# Altium footprint library Connector_Samtec_HLE_SMD.PcbLib: 290 footprints (part 8 of 24)
Each footprint in its own frame and in the unit in brackets; x right, y up, seen from the top. Pads: shape width x height; smd on the part's side, far side on the other; paste and mask are expansions set on the pad; w line width, h text height; cw(c..) or ccw(c..) is an arc to the next point about the centre after c.
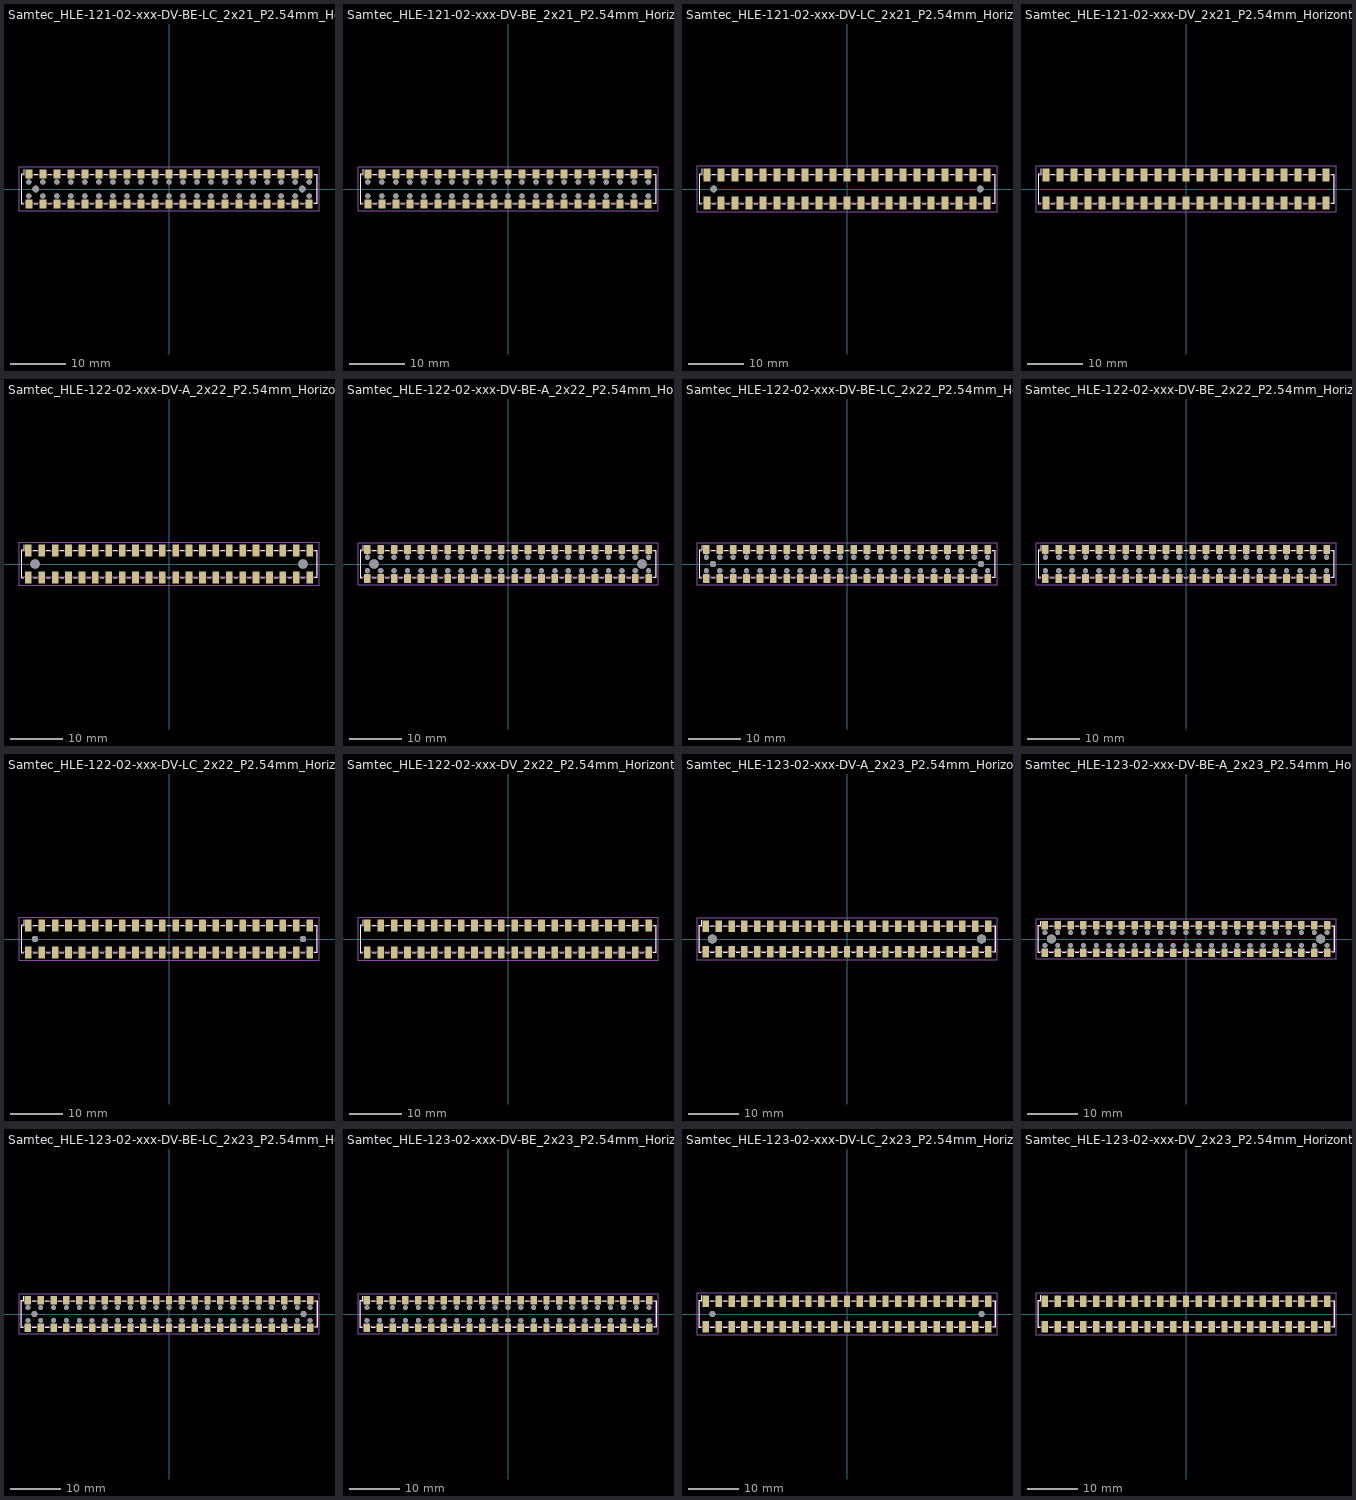
[diagram p7: the footprints below, top view; thin cyan lines are the x and y axes]

## Samtec_HLE-121-02-xxx-DV-BE-LC_2x21_P2.54mm_Horizontal [mm]
pads (86):
  rect 1.27x1.68 smd: 1(-25.4,2.72) 2(-25.4,-2.72) 3(-22.86,2.72) 4(-22.86,-2.72) 5(-20.32,2.72) 6(-20.32,-2.72) 7(-17.78,2.72) 8(-17.78,-2.72) 9(-15.24,2.72) 10(-15.24,-2.72) 11(-12.7,2.72) 12(-12.7,-2.72) 13(-10.16,2.72) 14(-10.16,-2.72) 15(-7.62,2.72) 16(-7.62,-2.72) 17(-5.08,2.72) 18(-5.08,-2.72) 19(-2.54,2.72) 20(-2.54,-2.72) 21(0,2.72) 22(0,-2.72) 23(2.54,2.72) 24(2.54,-2.72) 25(5.08,2.72) 26(5.08,-2.72) 27(7.62,2.72) 28(7.62,-2.72) 29(10.16,2.72) 30(10.16,-2.72) 31(12.7,2.72) 32(12.7,-2.72) 33(15.24,2.72) 34(15.24,-2.72) 35(17.78,2.72) 36(17.78,-2.72) 37(20.32,2.72) 38(20.32,-2.72) 39(22.86,2.72) 40(22.86,-2.72) 41(25.4,2.72) 42(25.4,-2.72)
  round 0.97 hole 0.97: Un1(25.4,-1.27) Un2(-7.62,-1.27) Un3(7.62,1.27) Un4(20.32,1.27) Un5(15.24,-1.27) Un6(5.08,-1.27) Un7(5.08,1.27) Un8(-2.54,1.27) Un9(0,-1.27) Un11(-20.32,1.27) Un12(-22.86,1.27) Un13(2.54,1.27) Un14(-17.78,-1.27) Un15(17.78,-1.27) Un16(22.86,1.27) Un17(-20.32,-1.27) Un18(17.78,1.27) Un19(-12.7,-1.27) Un20(-10.16,1.27) Un21(7.62,-1.27) Un22(-22.86,-1.27) Un23(-12.7,1.27) Un24(-5.08,1.27) Un25(2.54,-1.27) Un27(12.7,-1.27) Un28(-17.78,1.27) Un29(15.24,1.27) Un30(-15.24,-1.27) Un31(22.86,-1.27) Un32(25.4,1.27) Un33(0,1.27) Un34(-10.16,-1.27) Un35(-2.54,-1.27) Un36(20.32,-1.27) Un37(10.16,-1.27) Un38(10.16,1.27) Un39(-15.24,1.27) Un40(-25.4,1.27) Un41(-25.4,-1.27) Un42(-7.62,1.27) Un43(12.7,1.27) Un44(-5.08,-1.27)
  round 1.19 hole 1.19: Un10(-24.13,0) Un26(24.13,0)
F.SilkS:
  lines w0.12: -26.295,-2.65 -26.78,-2.65 -26.78,2.65 -26.295,2.65 -26.295,3.56 ; -24.505,-2.65 -23.755,-2.65 ; -24.505,2.65 -23.755,2.65 ; -21.965,-2.65 -21.215,-2.65 ; -21.965,2.65 -21.215,2.65 ; -19.425,-2.65 -18.675,-2.65 ; -19.425,2.65 -18.675,2.65 ; -16.885,-2.65 -16.135,-2.65 ; -16.885,2.65 -16.135,2.65 ; -14.345,-2.65 -13.595,-2.65 ; -14.345,2.65 -13.595,2.65 ; -11.805,-2.65 -11.055,-2.65 ; -11.805,2.65 -11.055,2.65 ; -9.265,-2.65 -8.515,-2.65 ; -9.265,2.65 -8.515,2.65 ; -6.725,-2.65 -5.975,-2.65 ; -6.725,2.65 -5.975,2.65 ; -4.185,-2.65 -3.435,-2.65 ; -4.185,2.65 -3.435,2.65 ; -1.645,-2.65 -0.895,-2.65 ; -1.645,2.65 -0.895,2.65 ; 0.895,-2.65 1.645,-2.65 ; 0.895,2.65 1.645,2.65 ; 3.435,-2.65 4.185,-2.65 ; 3.435,2.65 4.185,2.65 ; 5.975,-2.65 6.725,-2.65 ; 5.975,2.65 6.725,2.65 ; 8.515,-2.65 9.265,-2.65 ; 8.515,2.65 9.265,2.65 ; 11.055,-2.65 11.805,-2.65 ; 11.055,2.65 11.805,2.65 ; 13.595,-2.65 14.345,-2.65 ; 13.595,2.65 14.345,2.65 ; 16.135,-2.65 16.885,-2.65 ; 16.135,2.65 16.885,2.65 ; 18.675,-2.65 19.425,-2.65 ; 18.675,2.65 19.425,2.65 ; 21.215,-2.65 21.965,-2.65 ; 21.215,2.65 21.965,2.65 ; 23.755,-2.65 24.505,-2.65 ; 23.755,2.65 24.505,2.65 ; 26.295,-2.65 26.78,-2.65 26.78,2.65 26.295,2.65
F.CrtYd:
  lines w0.05: -27.17,-4.06 -27.17,4.06 27.17,4.06 27.17,-4.06 -27.17,-4.06
F.Fab:
  lines w0.1: -25.9,2.54 -25.4,1.833 -24.9,2.54 ; -26.67,-2.54 26.67,-2.54 26.67,2.54 -26.67,2.54 -26.67,-2.54
  text "'.Designator'" at -4.047,-2.68 h1

## Samtec_HLE-121-02-xxx-DV-BE_2x21_P2.54mm_Horizontal [mm]
pads (84):
  rect 1.27x1.68 smd: 1(-25.4,2.72) 2(-25.4,-2.72) 3(-22.86,2.72) 4(-22.86,-2.72) 5(-20.32,2.72) 6(-20.32,-2.72) 7(-17.78,2.72) 8(-17.78,-2.72) 9(-15.24,2.72) 10(-15.24,-2.72) 11(-12.7,2.72) 12(-12.7,-2.72) 13(-10.16,2.72) 14(-10.16,-2.72) 15(-7.62,2.72) 16(-7.62,-2.72) 17(-5.08,2.72) 18(-5.08,-2.72) 19(-2.54,2.72) 20(-2.54,-2.72) 21(0,2.72) 22(0,-2.72) 23(2.54,2.72) 24(2.54,-2.72) 25(5.08,2.72) 26(5.08,-2.72) 27(7.62,2.72) 28(7.62,-2.72) 29(10.16,2.72) 30(10.16,-2.72) 31(12.7,2.72) 32(12.7,-2.72) 33(15.24,2.72) 34(15.24,-2.72) 35(17.78,2.72) 36(17.78,-2.72) 37(20.32,2.72) 38(20.32,-2.72) 39(22.86,2.72) 40(22.86,-2.72) 41(25.4,2.72) 42(25.4,-2.72)
  round 0.97 hole 0.97: Un1(20.32,-1.27) Un2(20.32,1.27) Un3(10.16,-1.27) Un4(0,1.27) Un5(-5.08,-1.27) Un6(-17.78,-1.27) Un7(7.62,1.27) Un8(-15.24,-1.27) Un9(25.4,1.27) Un10(22.86,-1.27) Un11(-7.62,1.27) Un12(2.54,-1.27) Un13(-2.54,-1.27) Un14(15.24,1.27) Un15(-25.4,1.27) Un16(15.24,-1.27) Un17(-10.16,1.27) Un18(-5.08,1.27) Un19(0,-1.27) Un20(25.4,-1.27) Un21(-17.78,1.27) Un22(-12.7,1.27) Un23(-15.24,1.27) Un24(10.16,1.27) Un25(5.08,1.27) Un26(22.86,1.27) Un27(-7.62,-1.27) Un28(5.08,-1.27) Un29(7.62,-1.27) Un30(2.54,1.27) Un31(-20.32,1.27) Un32(12.7,-1.27) Un33(-25.4,-1.27) Un34(-10.16,-1.27) Un35(12.7,1.27) Un36(-22.86,1.27) Un37(-12.7,-1.27) Un38(-20.32,-1.27) Un39(17.78,-1.27) Un40(-22.86,-1.27) Un41(17.78,1.27) Un42(-2.54,1.27)
F.SilkS:
  lines w0.12: -26.295,-2.65 -26.78,-2.65 -26.78,2.65 -26.295,2.65 -26.295,3.56 ; -24.505,-2.65 -23.755,-2.65 ; -24.505,2.65 -23.755,2.65 ; -21.965,-2.65 -21.215,-2.65 ; -21.965,2.65 -21.215,2.65 ; -19.425,-2.65 -18.675,-2.65 ; -19.425,2.65 -18.675,2.65 ; -16.885,-2.65 -16.135,-2.65 ; -16.885,2.65 -16.135,2.65 ; -14.345,-2.65 -13.595,-2.65 ; -14.345,2.65 -13.595,2.65 ; -11.805,-2.65 -11.055,-2.65 ; -11.805,2.65 -11.055,2.65 ; -9.265,-2.65 -8.515,-2.65 ; -9.265,2.65 -8.515,2.65 ; -6.725,-2.65 -5.975,-2.65 ; -6.725,2.65 -5.975,2.65 ; -4.185,-2.65 -3.435,-2.65 ; -4.185,2.65 -3.435,2.65 ; -1.645,-2.65 -0.895,-2.65 ; -1.645,2.65 -0.895,2.65 ; 0.895,-2.65 1.645,-2.65 ; 0.895,2.65 1.645,2.65 ; 3.435,-2.65 4.185,-2.65 ; 3.435,2.65 4.185,2.65 ; 5.975,-2.65 6.725,-2.65 ; 5.975,2.65 6.725,2.65 ; 8.515,-2.65 9.265,-2.65 ; 8.515,2.65 9.265,2.65 ; 11.055,-2.65 11.805,-2.65 ; 11.055,2.65 11.805,2.65 ; 13.595,-2.65 14.345,-2.65 ; 13.595,2.65 14.345,2.65 ; 16.135,-2.65 16.885,-2.65 ; 16.135,2.65 16.885,2.65 ; 18.675,-2.65 19.425,-2.65 ; 18.675,2.65 19.425,2.65 ; 21.215,-2.65 21.965,-2.65 ; 21.215,2.65 21.965,2.65 ; 23.755,-2.65 24.505,-2.65 ; 23.755,2.65 24.505,2.65 ; 26.295,-2.65 26.78,-2.65 26.78,2.65 26.295,2.65
F.CrtYd:
  lines w0.05: -27.17,-4.06 -27.17,4.06 27.17,4.06 27.17,-4.06 -27.17,-4.06
F.Fab:
  lines w0.1: -25.9,2.54 -25.4,1.833 -24.9,2.54 ; -26.67,-2.54 -26.67,2.54 26.67,2.54 26.67,-2.54 -26.67,-2.54
  text "'.Designator'" at -4.047,-2.68 h1

## Samtec_HLE-121-02-xxx-DV-LC_2x21_P2.54mm_Horizontal [mm]
pads (44):
  rect 1.27x2.29 smd: 1(-25.4,2.525) 2(-25.4,-2.525) 3(-22.86,2.525) 4(-22.86,-2.525) 5(-20.32,2.525) 6(-20.32,-2.525) 7(-17.78,2.525) 8(-17.78,-2.525) 9(-15.24,2.525) 10(-15.24,-2.525) 11(-12.7,2.525) 12(-12.7,-2.525) 13(-10.16,2.525) 14(-10.16,-2.525) 15(-7.62,2.525) 16(-7.62,-2.525) 17(-5.08,2.525) 18(-5.08,-2.525) 19(-2.54,2.525) 20(-2.54,-2.525) 21(0,2.525) 22(0,-2.525) 23(2.54,2.525) 24(2.54,-2.525) 25(5.08,2.525) 26(5.08,-2.525) 27(7.62,2.525) 28(7.62,-2.525) 29(10.16,2.525) 30(10.16,-2.525) 31(12.7,2.525) 32(12.7,-2.525) 33(15.24,2.525) 34(15.24,-2.525) 35(17.78,2.525) 36(17.78,-2.525) 37(20.32,2.525) 38(20.32,-2.525) 39(22.86,2.525) 40(22.86,-2.525) 41(25.4,2.525) 42(25.4,-2.525)
  round 1.19 hole 1.19: Un1(-24.13,0) Un2(24.13,0)
F.SilkS:
  lines w0.12: -26.295,-2.65 -26.78,-2.65 -26.78,2.65 -26.295,2.65 -26.295,3.67 ; -24.505,-2.65 -23.755,-2.65 ; -24.505,2.65 -23.755,2.65 ; -21.965,-2.65 -21.215,-2.65 ; -21.965,2.65 -21.215,2.65 ; -19.425,-2.65 -18.675,-2.65 ; -19.425,2.65 -18.675,2.65 ; -16.885,-2.65 -16.135,-2.65 ; -16.885,2.65 -16.135,2.65 ; -14.345,-2.65 -13.595,-2.65 ; -14.345,2.65 -13.595,2.65 ; -11.805,-2.65 -11.055,-2.65 ; -11.805,2.65 -11.055,2.65 ; -9.265,-2.65 -8.515,-2.65 ; -9.265,2.65 -8.515,2.65 ; -6.725,-2.65 -5.975,-2.65 ; -6.725,2.65 -5.975,2.65 ; -4.185,-2.65 -3.435,-2.65 ; -4.185,2.65 -3.435,2.65 ; -1.645,-2.65 -0.895,-2.65 ; -1.645,2.65 -0.895,2.65 ; 0.895,-2.65 1.645,-2.65 ; 0.895,2.65 1.645,2.65 ; 3.435,-2.65 4.185,-2.65 ; 3.435,2.65 4.185,2.65 ; 5.975,-2.65 6.725,-2.65 ; 5.975,2.65 6.725,2.65 ; 8.515,-2.65 9.265,-2.65 ; 8.515,2.65 9.265,2.65 ; 11.055,-2.65 11.805,-2.65 ; 11.055,2.65 11.805,2.65 ; 13.595,-2.65 14.345,-2.65 ; 13.595,2.65 14.345,2.65 ; 16.135,-2.65 16.885,-2.65 ; 16.135,2.65 16.885,2.65 ; 18.675,-2.65 19.425,-2.65 ; 18.675,2.65 19.425,2.65 ; 21.215,-2.65 21.965,-2.65 ; 21.215,2.65 21.965,2.65 ; 23.755,-2.65 24.505,-2.65 ; 23.755,2.65 24.505,2.65 ; 26.295,-2.65 26.78,-2.65 26.78,2.65 26.295,2.65
F.CrtYd:
  lines w0.05: -27.17,-4.17 -27.17,4.17 27.17,4.17 27.17,-4.17 -27.17,-4.17
F.Fab:
  lines w0.1: -25.9,2.54 -25.4,1.833 -24.9,2.54 ; -26.67,-2.54 -26.67,2.54 26.67,2.54 26.67,-2.54 -26.67,-2.54
  text "'.Designator'" at -4.047,-2.68 h1

## Samtec_HLE-121-02-xxx-DV_2x21_P2.54mm_Horizontal [mm]
pads (42):
  rect 1.27x2.29 smd: 1(-25.4,2.525) 2(-25.4,-2.525) 3(-22.86,2.525) 4(-22.86,-2.525) 5(-20.32,2.525) 6(-20.32,-2.525) 7(-17.78,2.525) 8(-17.78,-2.525) 9(-15.24,2.525) 10(-15.24,-2.525) 11(-12.7,2.525) 12(-12.7,-2.525) 13(-10.16,2.525) 14(-10.16,-2.525) 15(-7.62,2.525) 16(-7.62,-2.525) 17(-5.08,2.525) 18(-5.08,-2.525) 19(-2.54,2.525) 20(-2.54,-2.525) 21(0,2.525) 22(0,-2.525) 23(2.54,2.525) 24(2.54,-2.525) 25(5.08,2.525) 26(5.08,-2.525) 27(7.62,2.525) 28(7.62,-2.525) 29(10.16,2.525) 30(10.16,-2.525) 31(12.7,2.525) 32(12.7,-2.525) 33(15.24,2.525) 34(15.24,-2.525) 35(17.78,2.525) 36(17.78,-2.525) 37(20.32,2.525) 38(20.32,-2.525) 39(22.86,2.525) 40(22.86,-2.525) 41(25.4,2.525) 42(25.4,-2.525)
F.SilkS:
  lines w0.12: -26.295,-2.65 -26.78,-2.65 -26.78,2.65 -26.295,2.65 -26.295,3.67 ; -24.505,-2.65 -23.755,-2.65 ; -24.505,2.65 -23.755,2.65 ; -21.965,-2.65 -21.215,-2.65 ; -21.965,2.65 -21.215,2.65 ; -19.425,-2.65 -18.675,-2.65 ; -19.425,2.65 -18.675,2.65 ; -16.885,-2.65 -16.135,-2.65 ; -16.885,2.65 -16.135,2.65 ; -14.345,-2.65 -13.595,-2.65 ; -14.345,2.65 -13.595,2.65 ; -11.805,-2.65 -11.055,-2.65 ; -11.805,2.65 -11.055,2.65 ; -9.265,-2.65 -8.515,-2.65 ; -9.265,2.65 -8.515,2.65 ; -6.725,-2.65 -5.975,-2.65 ; -6.725,2.65 -5.975,2.65 ; -4.185,-2.65 -3.435,-2.65 ; -4.185,2.65 -3.435,2.65 ; -1.645,-2.65 -0.895,-2.65 ; -1.645,2.65 -0.895,2.65 ; 0.895,-2.65 1.645,-2.65 ; 0.895,2.65 1.645,2.65 ; 3.435,-2.65 4.185,-2.65 ; 3.435,2.65 4.185,2.65 ; 5.975,-2.65 6.725,-2.65 ; 5.975,2.65 6.725,2.65 ; 8.515,-2.65 9.265,-2.65 ; 8.515,2.65 9.265,2.65 ; 11.055,-2.65 11.805,-2.65 ; 11.055,2.65 11.805,2.65 ; 13.595,-2.65 14.345,-2.65 ; 13.595,2.65 14.345,2.65 ; 16.135,-2.65 16.885,-2.65 ; 16.135,2.65 16.885,2.65 ; 18.675,-2.65 19.425,-2.65 ; 18.675,2.65 19.425,2.65 ; 21.215,-2.65 21.965,-2.65 ; 21.215,2.65 21.965,2.65 ; 23.755,-2.65 24.505,-2.65 ; 23.755,2.65 24.505,2.65 ; 26.295,-2.65 26.78,-2.65 26.78,2.65 26.295,2.65
F.CrtYd:
  lines w0.05: -27.17,-4.17 -27.17,4.17 27.17,4.17 27.17,-4.17 -27.17,-4.17
F.Fab:
  lines w0.1: -25.9,2.54 -25.4,1.833 -24.9,2.54 ; -26.67,-2.54 -26.67,2.54 26.67,2.54 26.67,-2.54 -26.67,-2.54
  text "'.Designator'" at -4.047,-2.68 h1

## Samtec_HLE-122-02-xxx-DV-A_2x22_P2.54mm_Horizontal [mm]
pads (46):
  rect 1.27x2.29 smd: 1(-26.67,2.525) 2(-26.67,-2.525) 3(-24.13,2.525) 4(-24.13,-2.525) 5(-21.59,2.525) 6(-21.59,-2.525) 7(-19.05,2.525) 8(-19.05,-2.525) 9(-16.51,2.525) 10(-16.51,-2.525) 11(-13.97,2.525) 12(-13.97,-2.525) 13(-11.43,2.525) 14(-11.43,-2.525) 15(-8.89,2.525) 16(-8.89,-2.525) 17(-6.35,2.525) 18(-6.35,-2.525) 19(-3.81,2.525) 20(-3.81,-2.525) 21(-1.27,2.525) 22(-1.27,-2.525) 23(1.27,2.525) 24(1.27,-2.525) 25(3.81,2.525) 26(3.81,-2.525) 27(6.35,2.525) 28(6.35,-2.525) 29(8.89,2.525) 30(8.89,-2.525) 31(11.43,2.525) 32(11.43,-2.525) 33(13.97,2.525) 34(13.97,-2.525) 35(16.51,2.525) 36(16.51,-2.525) 37(19.05,2.525) 38(19.05,-2.525) 39(21.59,2.525) 40(21.59,-2.525) 41(24.13,2.525) 42(24.13,-2.525) 43(26.67,2.525) 44(26.67,-2.525)
  round 1.78 hole 1.78: Un1(-25.4,0) Un2(25.4,0)
F.SilkS:
  lines w0.12: -27.565,-2.65 -28.05,-2.65 -28.05,2.65 -27.565,2.65 -27.565,3.67 ; -25.775,-2.65 -25.025,-2.65 ; -25.775,2.65 -25.025,2.65 ; -23.235,-2.65 -22.485,-2.65 ; -23.235,2.65 -22.485,2.65 ; -20.695,-2.65 -19.945,-2.65 ; -20.695,2.65 -19.945,2.65 ; -18.155,-2.65 -17.405,-2.65 ; -18.155,2.65 -17.405,2.65 ; -15.615,-2.65 -14.865,-2.65 ; -15.615,2.65 -14.865,2.65 ; -13.075,-2.65 -12.325,-2.65 ; -13.075,2.65 -12.325,2.65 ; -10.535,-2.65 -9.785,-2.65 ; -10.535,2.65 -9.785,2.65 ; -7.995,-2.65 -7.245,-2.65 ; -7.995,2.65 -7.245,2.65 ; -5.455,-2.65 -4.705,-2.65 ; -5.455,2.65 -4.705,2.65 ; -2.915,-2.65 -2.165,-2.65 ; -2.915,2.65 -2.165,2.65 ; -0.375,-2.65 0.375,-2.65 ; -0.375,2.65 0.375,2.65 ; 2.165,-2.65 2.915,-2.65 ; 2.165,2.65 2.915,2.65 ; 4.705,-2.65 5.455,-2.65 ; 4.705,2.65 5.455,2.65 ; 7.245,-2.65 7.995,-2.65 ; 7.245,2.65 7.995,2.65 ; 9.785,-2.65 10.535,-2.65 ; 9.785,2.65 10.535,2.65 ; 12.325,-2.65 13.075,-2.65 ; 12.325,2.65 13.075,2.65 ; 14.865,-2.65 15.615,-2.65 ; 14.865,2.65 15.615,2.65 ; 17.405,-2.65 18.155,-2.65 ; 17.405,2.65 18.155,2.65 ; 19.945,-2.65 20.695,-2.65 ; 19.945,2.65 20.695,2.65 ; 22.485,-2.65 23.235,-2.65 ; 22.485,2.65 23.235,2.65 ; 25.025,-2.65 25.775,-2.65 ; 25.025,2.65 25.775,2.65 ; 27.565,-2.65 28.05,-2.65 28.05,2.65 27.565,2.65
F.CrtYd:
  lines w0.05: -28.44,-4.17 -28.44,4.17 28.44,4.17 28.44,-4.17 -28.44,-4.17
F.Fab:
  lines w0.1: -27.17,2.54 -26.67,1.833 -26.17,2.54 ; -27.94,-2.54 -27.94,2.54 27.94,2.54 27.94,-2.54 -27.94,-2.54
  text "'.Designator'" at -4.047,-2.68 h1

## Samtec_HLE-122-02-xxx-DV-BE-A_2x22_P2.54mm_Horizontal [mm]
pads (90):
  rect 1.27x1.68 smd: 1(-26.67,2.72) 2(-26.67,-2.72) 3(-24.13,2.72) 4(-24.13,-2.72) 5(-21.59,2.72) 6(-21.59,-2.72) 7(-19.05,2.72) 8(-19.05,-2.72) 9(-16.51,2.72) 10(-16.51,-2.72) 11(-13.97,2.72) 12(-13.97,-2.72) 13(-11.43,2.72) 14(-11.43,-2.72) 15(-8.89,2.72) 16(-8.89,-2.72) 17(-6.35,2.72) 18(-6.35,-2.72) 19(-3.81,2.72) 20(-3.81,-2.72) 21(-1.27,2.72) 22(-1.27,-2.72) 23(1.27,2.72) 24(1.27,-2.72) 25(3.81,2.72) 26(3.81,-2.72) 27(6.35,2.72) 28(6.35,-2.72) 29(8.89,2.72) 30(8.89,-2.72) 31(11.43,2.72) 32(11.43,-2.72) 33(13.97,2.72) 34(13.97,-2.72) 35(16.51,2.72) 36(16.51,-2.72) 37(19.05,2.72) 38(19.05,-2.72) 39(21.59,2.72) 40(21.59,-2.72) 41(24.13,2.72) 42(24.13,-2.72) 43(26.67,2.72) 44(26.67,-2.72)
  round 0.97 hole 0.97: Un1(-24.13,-1.27) Un2(-19.05,1.27) Un3(6.35,-1.27) Un4(19.05,-1.27) Un5(19.05,1.27) Un6(-13.97,1.27) Un7(3.81,-1.27) Un8(1.27,-1.27) Un9(16.51,1.27) Un10(-16.51,1.27) Un11(-19.05,-1.27) Un12(3.81,1.27) Un13(-24.13,1.27) Un14(-21.59,1.27) Un15(-26.67,-1.27) Un17(-11.43,-1.27) Un18(26.67,1.27) Un19(21.59,-1.27) Un20(13.97,-1.27) Un21(24.13,-1.27) Un22(-6.35,-1.27) Un23(-8.89,-1.27) Un24(26.67,-1.27) Un25(-6.35,1.27) Un26(-1.27,-1.27) Un27(-11.43,1.27) Un28(-8.89,1.27) Un29(21.59,1.27) Un30(-3.81,1.27) Un31(8.89,1.27) Un32(16.51,-1.27) Un33(-26.67,1.27) Un34(-1.27,1.27) Un35(-16.51,-1.27) Un36(11.43,1.27) Un38(1.27,1.27) Un39(11.43,-1.27) Un40(24.13,1.27) Un41(8.89,-1.27) Un42(6.35,1.27) Un43(-3.81,-1.27) Un44(-13.97,-1.27) Un45(-21.59,-1.27) Un46(13.97,1.27)
  round 1.78 hole 1.78: Un16(25.4,0) Un37(-25.4,0)
F.SilkS:
  lines w0.12: -27.565,-2.65 -28.05,-2.65 -28.05,2.65 -27.565,2.65 -27.565,3.56 ; -25.775,-2.65 -25.025,-2.65 ; -25.775,2.65 -25.025,2.65 ; -23.235,-2.65 -22.485,-2.65 ; -23.235,2.65 -22.485,2.65 ; -20.695,-2.65 -19.945,-2.65 ; -20.695,2.65 -19.945,2.65 ; -18.155,-2.65 -17.405,-2.65 ; -18.155,2.65 -17.405,2.65 ; -15.615,-2.65 -14.865,-2.65 ; -15.615,2.65 -14.865,2.65 ; -13.075,-2.65 -12.325,-2.65 ; -13.075,2.65 -12.325,2.65 ; -10.535,-2.65 -9.785,-2.65 ; -10.535,2.65 -9.785,2.65 ; -7.995,-2.65 -7.245,-2.65 ; -7.995,2.65 -7.245,2.65 ; -5.455,-2.65 -4.705,-2.65 ; -5.455,2.65 -4.705,2.65 ; -2.915,-2.65 -2.165,-2.65 ; -2.915,2.65 -2.165,2.65 ; -0.375,-2.65 0.375,-2.65 ; -0.375,2.65 0.375,2.65 ; 2.165,-2.65 2.915,-2.65 ; 2.165,2.65 2.915,2.65 ; 4.705,-2.65 5.455,-2.65 ; 4.705,2.65 5.455,2.65 ; 7.245,-2.65 7.995,-2.65 ; 7.245,2.65 7.995,2.65 ; 9.785,-2.65 10.535,-2.65 ; 9.785,2.65 10.535,2.65 ; 12.325,-2.65 13.075,-2.65 ; 12.325,2.65 13.075,2.65 ; 14.865,-2.65 15.615,-2.65 ; 14.865,2.65 15.615,2.65 ; 17.405,-2.65 18.155,-2.65 ; 17.405,2.65 18.155,2.65 ; 19.945,-2.65 20.695,-2.65 ; 19.945,2.65 20.695,2.65 ; 22.485,-2.65 23.235,-2.65 ; 22.485,2.65 23.235,2.65 ; 25.025,-2.65 25.775,-2.65 ; 25.025,2.65 25.775,2.65 ; 27.565,-2.65 28.05,-2.65 28.05,2.65 27.565,2.65
F.CrtYd:
  lines w0.05: -28.44,-4.06 -28.44,4.06 28.44,4.06 28.44,-4.06 -28.44,-4.06
F.Fab:
  lines w0.1: -27.17,2.54 -26.67,1.833 -26.17,2.54 ; -27.94,-2.54 -27.94,2.54 27.94,2.54 27.94,-2.54 -27.94,-2.54
  text "'.Designator'" at -4.047,-2.68 h1

## Samtec_HLE-122-02-xxx-DV-BE-LC_2x22_P2.54mm_Horizontal [mm]
pads (90):
  rect 1.27x1.68 smd: 1(-26.67,2.72) 2(-26.67,-2.72) 3(-24.13,2.72) 4(-24.13,-2.72) 5(-21.59,2.72) 6(-21.59,-2.72) 7(-19.05,2.72) 8(-19.05,-2.72) 9(-16.51,2.72) 10(-16.51,-2.72) 11(-13.97,2.72) 12(-13.97,-2.72) 13(-11.43,2.72) 14(-11.43,-2.72) 15(-8.89,2.72) 16(-8.89,-2.72) 17(-6.35,2.72) 18(-6.35,-2.72) 19(-3.81,2.72) 20(-3.81,-2.72) 21(-1.27,2.72) 22(-1.27,-2.72) 23(1.27,2.72) 24(1.27,-2.72) 25(3.81,2.72) 26(3.81,-2.72) 27(6.35,2.72) 28(6.35,-2.72) 29(8.89,2.72) 30(8.89,-2.72) 31(11.43,2.72) 32(11.43,-2.72) 33(13.97,2.72) 34(13.97,-2.72) 35(16.51,2.72) 36(16.51,-2.72) 37(19.05,2.72) 38(19.05,-2.72) 39(21.59,2.72) 40(21.59,-2.72) 41(24.13,2.72) 42(24.13,-2.72) 43(26.67,2.72) 44(26.67,-2.72)
  round 0.97 hole 0.97: Un1(-11.43,-1.27) Un2(-16.51,-1.27) Un3(19.05,1.27) Un4(-19.05,-1.27) Un5(-13.97,1.27) Un6(6.35,-1.27) Un7(13.97,1.27) Un8(19.05,-1.27) Un9(24.13,-1.27) Un10(16.51,-1.27) Un11(-26.67,-1.27) Un12(21.59,-1.27) Un13(-13.97,-1.27) Un15(16.51,1.27) Un16(-19.05,1.27) Un17(-16.51,1.27) Un18(11.43,-1.27) Un19(8.89,1.27) Un20(-21.59,1.27) Un21(3.81,-1.27) Un22(8.89,-1.27) Un23(-24.13,1.27) Un24(-3.81,-1.27) Un25(-6.35,-1.27) Un26(-1.27,1.27) Un27(1.27,-1.27) Un28(3.81,1.27) Un29(-3.81,1.27) Un30(26.67,-1.27) Un31(6.35,1.27) Un32(-11.43,1.27) Un33(24.13,1.27) Un34(-8.89,1.27) Un35(13.97,-1.27) Un36(-24.13,-1.27) Un37(1.27,1.27) Un38(-26.67,1.27) Un39(21.59,1.27) Un40(11.43,1.27) Un41(-21.59,-1.27) Un43(-1.27,-1.27) Un44(-6.35,1.27) Un45(-8.89,-1.27) Un46(26.67,1.27)
  round 1.19 hole 1.19: Un14(25.4,0) Un42(-25.4,0)
F.SilkS:
  lines w0.12: -27.565,-2.65 -28.05,-2.65 -28.05,2.65 -27.565,2.65 -27.565,3.56 ; -25.775,-2.65 -25.025,-2.65 ; -25.775,2.65 -25.025,2.65 ; -23.235,-2.65 -22.485,-2.65 ; -23.235,2.65 -22.485,2.65 ; -20.695,-2.65 -19.945,-2.65 ; -20.695,2.65 -19.945,2.65 ; -18.155,-2.65 -17.405,-2.65 ; -18.155,2.65 -17.405,2.65 ; -15.615,-2.65 -14.865,-2.65 ; -15.615,2.65 -14.865,2.65 ; -13.075,-2.65 -12.325,-2.65 ; -13.075,2.65 -12.325,2.65 ; -10.535,-2.65 -9.785,-2.65 ; -10.535,2.65 -9.785,2.65 ; -7.995,-2.65 -7.245,-2.65 ; -7.995,2.65 -7.245,2.65 ; -5.455,-2.65 -4.705,-2.65 ; -5.455,2.65 -4.705,2.65 ; -2.915,-2.65 -2.165,-2.65 ; -2.915,2.65 -2.165,2.65 ; -0.375,-2.65 0.375,-2.65 ; -0.375,2.65 0.375,2.65 ; 2.165,-2.65 2.915,-2.65 ; 2.165,2.65 2.915,2.65 ; 4.705,-2.65 5.455,-2.65 ; 4.705,2.65 5.455,2.65 ; 7.245,-2.65 7.995,-2.65 ; 7.245,2.65 7.995,2.65 ; 9.785,-2.65 10.535,-2.65 ; 9.785,2.65 10.535,2.65 ; 12.325,-2.65 13.075,-2.65 ; 12.325,2.65 13.075,2.65 ; 14.865,-2.65 15.615,-2.65 ; 14.865,2.65 15.615,2.65 ; 17.405,-2.65 18.155,-2.65 ; 17.405,2.65 18.155,2.65 ; 19.945,-2.65 20.695,-2.65 ; 19.945,2.65 20.695,2.65 ; 22.485,-2.65 23.235,-2.65 ; 22.485,2.65 23.235,2.65 ; 25.025,-2.65 25.775,-2.65 ; 25.025,2.65 25.775,2.65 ; 27.565,-2.65 28.05,-2.65 28.05,2.65 27.565,2.65
F.CrtYd:
  lines w0.05: -28.44,-4.06 -28.44,4.06 28.44,4.06 28.44,-4.06 -28.44,-4.06
F.Fab:
  lines w0.1: -27.17,2.54 -26.67,1.833 -26.17,2.54 ; -27.94,-2.54 -27.94,2.54 27.94,2.54 27.94,-2.54 -27.94,-2.54
  text "'.Designator'" at -4.047,-2.68 h1
